# Altium footprint library Miscellaneous THD.PcbLib: 216 footprints (part 14 of 15) (continued)
## WURTH_651 005 136 421 [mm] "Mini USB 2.0 Type B Vertical 5 Contacts WR-COM"
height 9.2
pads (7):
  round 1.3 hole 0.6: 1(-1.6,-0.95) 2(-0.8,0.95) 3(0,-0.95) 4(0.8,0.95) 5(1.6,-0.95)
  round 2.7 hole 2: 6(-4.2,0) 6(4.2,0)
Top Overlay:
  lines w0.2: -3.85,-1.664 -3.85,-1.98 3.85,-1.98 3.85,-1.664 ; -3.794,1.651 cw(c-3.35,1.42) -3.35,1.92 -1.043,1.92 ; -3.35,1.52 -1.622,1.52 ; -3.33,-1.461 -3.33,-1.48 ccw(c-2.83,-1.48) -2.83,-1.98 ; -2.93,-1.13 -2.93,-1.48 ccw(c-2.83,-1.48) -2.83,-1.58 -2.377,-1.58 ; -2.625,1.52 -2.625,1.27 -2.025,1.27 -2.025,1.52 ; -2.3,-0.236 -2.3,0.377 -2.3,0.47 cw(c-2.2,0.47) -2.2,0.57 -1.725,0.57 ; -1.8,0.57 -1.8,1.02 ; -0.557,1.92 0.557,1.92 ; 1.043,1.92 3.351,1.92 ; 1.622,1.52 3.35,1.52 ; 1.725,0.57 2.2,0.57 cw(c2.2,0.47) 2.3,0.47 2.3,0.377 2.3,-0.236 ; 1.8,0.57 1.8,1.02 ; 2.025,1.52 2.025,1.27 2.625,1.27 2.625,1.52 ; 2.377,-1.58 2.83,-1.58 ccw(c2.83,-1.48) 2.93,-1.48 2.93,-1.13 ; 2.83,-1.98 ccw(c2.83,-1.48) 3.33,-1.48 3.33,-1.461 ; 3.35,1.92 cw(c3.351,1.423) 3.793,1.651
Mechanical 8:
  lines w0.05: -4.7,0 -4.2,0 ; -4.2,-0.5 -4.2,0 ; -4.2,0.5 -4.2,0 ; -3.7,0 -4.2,0 ; -2.1,-0.95 -1.6,-0.95 ; -1.6,-1.45 -1.6,-0.95 ; -1.6,-0.45 -1.6,-0.95 ; -1.3,0.95 -0.8,0.95 ; -1.1,-0.95 -1.6,-0.95 ; -0.8,0.45 -0.8,0.95 ; -0.8,1.45 -0.8,0.95 ; -0.5,-0.95 0,-0.95 ; -0.5,0 0,0 ; -0.3,0.95 -0.8,0.95 ; 0,-1.45 0,-0.95 ; 0,-0.45 0,-0.95 ; 0,0.5 0,0 ; 0.3,0.95 0.8,0.95 ; 0.5,-0.95 0,-0.95 ; 0.5,0 0,0 ; 0.8,0.45 0.8,0.95 ; 0.8,1.45 0.8,0.95 ; 1.1,-0.95 1.6,-0.95 ; 1.3,0.95 0.8,0.95 ; 1.6,-1.45 1.6,-0.95 ; 1.6,-0.45 1.6,-0.95 ; 2.1,-0.95 1.6,-0.95 ; 3.7,0 4.2,0 ; 4.2,-0.5 4.2,0 ; 4.2,0.5 4.2,0 ; 4.7,0 4.2,0
Mechanical 14:
  lines w0.1: -3.85,-0.75 -5.1,-0.75 -5.1,0.75 -3.85,0.75 ; -3.45,-0.38 -3.33,-0.38 ; -3.45,-0.237 -3.45,-1.88 ; -3.45,0.52 -3.1,0.52 -3.1,-0.004 ; -2.83,-1.98 cw(c-2.83,-1.48) -3.33,-1.48 -3.33,-0.38 ; -2.625,1.52 -2.625,1.421 -2.625,1.298 -2.625,1.27 -2.025,1.27 -2.025,1.298 -2.025,1.421 -2.025,1.52 ; -1.8,0.57 -1.8,1.02 -1.4,1.02 -1.4,0.57 ; -1.785,0.57 -1.785,0.82 -1.415,0.82 -1.415,0.57 ; -1.7,-0.355 -1.7,-0.105 ; -1.5,-0.355 -1.5,-0.105 ; -1,0.57 -1,1.02 -0.76,1.02 ; -0.985,0.57 -0.985,0.82 -0.615,0.82 -0.615,0.57 ; -0.9,-0.355 -0.9,-0.105 ; -0.76,1.52 -0.76,1.298 -0.76,1.02 ; -0.7,-0.355 -0.7,-0.105 ; -0.6,0.57 -0.6,1.02 ; -0.2,0.57 -0.2,1.02 ; -0.185,0.57 -0.185,0.82 0.185,0.82 0.185,0.57 ; -0.1,-0.355 -0.1,-0.105 ; 0.1,-0.355 0.1,-0.105 ; 0.2,0.57 0.2,1.02 ; 0.6,0.57 0.6,1.02 ; 0.615,0.57 0.615,0.82 0.985,0.82 0.985,0.57 ; 0.7,-0.355 0.7,-0.105 ; 0.74,1.52 0.74,1.298 0.74,1.02 ; 0.9,-0.355 0.9,-0.105 ; 1,0.57 1,1.02 0.74,1.02 ; 1.4,0.57 1.4,1.02 1.8,1.02 1.8,0.57 ; 1.415,0.57 1.415,0.82 1.785,0.82 1.785,0.57 ; 1.5,-0.355 1.5,-0.105 ; 1.7,-0.355 1.7,-0.105 ; 2.025,1.52 2.025,1.421 2.025,1.298 2.025,1.27 2.625,1.27 2.625,1.298 2.625,1.421 2.625,1.52 ; 2.83,-1.98 ccw(c2.83,-1.48) 3.33,-1.48 3.33,-0.38 ; 3.1,-0.004 3.1,0.52 3.45,0.52 ; 3.45,-0.38 3.33,-0.38 ; 3.45,-0.237 3.45,-1.88 ; 3.85,-0.75 5.1,-0.75 5.1,0.75 3.85,0.75 ; -3.85,0.32 ccw(c-3.35,0.32) -3.659,-0.073 -3.368,-0.301 cw(c-3.43,-0.38) -3.33,-0.38 ; -3.85,0.32 -3.85,0.22 -3.85,-1.98 -3.45,-1.98 -3.45,-1.88 ; -3.85,0.32 -3.85,1.42 cw(c-3.35,1.42) -3.35,1.92 3.35,1.92 cw(c3.35,1.42) 3.85,1.42 3.85,0.32 ; -3.45,-1.88 ccw(c-3.35,-1.88) -3.35,-1.98 3.35,-1.98 ccw(c3.35,-1.88) 3.45,-1.88 ; -3.35,1.52 ccw(c-3.35,1.42) -3.45,1.42 -3.45,0.32 ccw(c-3.35,0.32) -3.412,0.241 -3.121,0.013 cw(c-3.43,-0.38) -2.93,-0.38 -2.93,-1.48 ccw(c-2.83,-1.48) -2.83,-1.58 2.83,-1.58 ccw(c2.83,-1.48) 2.93,-1.48 2.93,-0.38 cw(c3.43,-0.38) 3.121,0.013 3.412,0.241 ccw(c3.35,0.32) 3.45,0.32 3.45,1.42 ccw(c3.35,1.42) 3.35,1.52 ; -3.35,1.52 3.35,1.52 ; -3.35,1.52 3.35,1.52 ; -0.76,1.02 0.74,1.02 ; 3.33,-0.38 cw(c3.43,-0.38) 3.368,-0.301 3.659,-0.073 ccw(c3.35,0.32) 3.85,0.32 ; 3.45,-1.88 3.45,-1.98 3.85,-1.98 3.85,0.22 3.85,0.32 ; -2.3,-0.389 ccw(c-2.2,-0.389) -2.271,-0.459 -1.729,-1.001 ccw(c-1.659,-0.93) -1.659,-1.03 1.659,-1.03 ccw(c1.659,-0.93) 1.729,-1.001 2.271,-0.459 ccw(c2.2,-0.389) 2.3,-0.389 2.3,0.377 2.3,0.47 ccw(c2.2,0.47) 2.2,0.57 -2.2,0.57 ccw(c-2.2,0.47) -2.3,0.47 -2.3,0.377 -2.3,-0.389 ; -1.8,-0.355 -1.4,-0.355 -1.4,-0.105 -1.8,-0.105 -1.8,-0.355 ; -1,-0.355 -0.6,-0.355 -0.6,-0.105 -1,-0.105 -1,-0.355 ; -0.2,-0.355 -0.2,-0.105 0.2,-0.105 0.2,-0.355 -0.2,-0.355 ; 0.6,-0.355 1,-0.355 1,-0.105 0.6,-0.105 0.6,-0.355 ; 1.4,-0.355 1.8,-0.355 1.8,-0.105 1.4,-0.105 1.4,-0.355
3D body "WURTH_651 005 136 421.stp": height 9.2, standoff -2.8, extent -5.098,-1.98 5.099,1.92

## WURTH_662 002 211 22 [mm] "2 Contacts, Pitch 3mm, Dual Row Vertical Header"
height 10.05
pads (4):
  round 1.7 hole 1: 1(0,-1.5) 2(0,1.5)
  round 0.5 hole 1 unplated mask+0.25: P1(-3,2.44) P2(3,2.44)
Top Overlay:
  circle w0.3: c1.805,-4.377 r0.15
  lines w0.2: -3.35,-3.43 3.35,-3.43 ; -3.35,1.665 -3.35,-3.93 -2.45,-3.93 -2.45,-3.43 ; -3.35,3.215 -3.35,3.43 3.35,3.43 3.35,3.215 ; -2.35,-3.43 -2.35,-1.03 -1.95,-1.03 -1.95,-3.43 ; -2.35,-1.5 -1.95,-1.5 ; -2.35,1.5 -1.95,1.5 ; -2.35,1.892 -2.35,0.95 -1.95,0.95 -1.95,2.75 -2.209,2.75 ; -1.1,-3.43 -1.1,-3.93 -0.15,-3.93 -0.15,-3.43 ; -0.7,3.43 -0.7,4.83 0.7,4.83 0.7,3.43 ; 0.15,-3.43 0.15,-3.93 1.1,-3.93 1.1,-3.43 ; 1.95,-3.43 1.95,-1.03 2.35,-1.03 2.35,-3.43 ; 1.95,-1.5 2.35,-1.5 ; 1.95,1.5 2.35,1.5 ; 2.209,2.75 1.95,2.75 1.95,0.95 2.35,0.95 2.35,1.892 ; 2.45,-3.43 2.45,-3.93 3.35,-3.93 3.35,1.665 ; -2.35,-0.64 -2.35,0.56 -1.95,0.56 -1.95,-0.64 -2.35,-0.64 ; -1.25,-2.75 0.75,-2.75 1.25,-2.25 1.25,-0.25 -1.25,-0.25 -1.25,-2.75 ; -1.25,0.25 -1.25,2.75 1.25,2.75 1.25,0.25 -1.25,0.25 ; 1.95,-0.64 2.35,-0.64 2.35,0.56 1.95,0.56 1.95,-0.64
Mechanical 8:
  lines w0.05: -3.5,2.44 -3,2.44 ; -3,1.94 -3,2.44 ; -3,2.94 -3,2.44 ; -2.5,2.44 -3,2.44 ; -0.5,-1.5 0,-1.5 ; -0.5,1.5 0,1.5 ; 0,-2 0,-1.5 ; 0,-1 0,-1.5 ; 0,1 0,1.5 ; 0,2 0,1.5 ; 0.5,-1.5 0,-1.5 ; 0.5,1.5 0,1.5 ; 2.5,2.44 3,2.44 ; 3,1.94 3,2.44 ; 3,2.94 3,2.44 ; 3.5,2.44 3,2.44
Mechanical 14:
  circle w0.3: c1.805,-4.377 r0.15
  lines w0.1: -3.35,-3.43 3.35,-3.43 ; -2.45,-3.43 -2.45,-3.93 -3.35,-3.93 -3.35,3.43 3.35,3.43 3.35,-3.93 2.45,-3.93 2.45,-3.43 ; -2.35,-3.43 -2.35,-1.03 -1.95,-1.03 -1.95,-3.43 ; -2.35,-1.5 -1.95,-1.5 ; -2.35,1.5 -1.95,1.5 ; -1.1,-3.43 -1.1,-3.93 -0.15,-3.93 -0.15,-3.43 ; -0.7,3.43 -0.7,4.83 0.7,4.83 0.7,3.43 ; 0.15,-3.43 0.15,-3.93 1.1,-3.93 1.1,-3.43 ; 1.95,-3.43 1.95,-1.03 2.35,-1.03 2.35,-3.43 ; 1.95,-1.5 2.35,-1.5 ; 1.95,1.5 2.35,1.5 ; -0.32,-1.82 -0.12,-1.62 ; -0.32,-1.82 -0.32,-1.18 ; -0.32,-1.82 0.32,-1.82 ; -0.32,-1.18 -0.12,-1.38 ; -0.32,-1.18 0.32,-1.18 ; -0.32,1.18 -0.32,1.82 ; -0.32,1.18 -0.12,1.38 ; -0.32,1.18 0.32,1.18 ; -0.32,1.82 0.32,1.82 ; -0.32,1.82 -0.12,1.62 ; -0.12,-1.62 -0.12,-1.38 ; -0.12,-1.62 0.12,-1.62 ; -0.12,-1.38 0.12,-1.38 ; -0.12,1.38 0.12,1.38 ; -0.12,1.38 -0.12,1.62 ; -0.12,1.62 0.12,1.62 ; 0.12,-1.62 0.32,-1.82 ; 0.12,-1.62 0.12,-1.38 ; 0.12,-1.38 0.32,-1.18 ; 0.12,1.38 0.32,1.18 ; 0.12,1.38 0.12,1.62 ; 0.12,1.62 0.32,1.82 ; 0.32,-1.82 0.32,-1.18 ; 0.32,1.18 0.32,1.82 ; -2.35,-0.64 -2.35,0.56 -1.95,0.56 -1.95,-0.64 -2.35,-0.64 ; -2.35,0.95 -2.35,2.75 -1.95,2.75 -1.95,0.95 -2.35,0.95 ; -1.25,-2.75 0.75,-2.75 1.25,-2.25 1.25,-0.25 -1.25,-0.25 -1.25,-2.75 ; -1.25,0.25 -1.25,2.75 1.25,2.75 1.25,0.25 -1.25,0.25 ; 1.95,-0.64 2.35,-0.64 2.35,0.56 1.95,0.56 1.95,-0.64 ; 1.95,0.95 2.35,0.95 2.35,2.75 1.95,2.75 1.95,0.95
3D body "WURTH_662 002 211 22.stp": height 9.9, standoff -3.2, extent -3.35,-3.93 3.35,4.83

## WURTH_662 004 110 22 [mm] "4 Contacts, Pitch 3mm, Single Row Angled Header"
height 5.57
pads (6):
  round 1.7 hole 1: 1(-4.5,0) 2(-1.5,0) 3(1.5,0) 4(4.5,0)
  round 0.5 hole 3 unplated mask+1.25: P1(-2.35,4.32) P2(2.35,4.32)
Top Overlay:
  circle w0.3: c-5.55,-1.8 r0.15
  lines w0.2: -5.132,-1.02 -6.525,-1.02 -6.525,0.48 -6.925,0.48 -6.925,-1.02 -7.825,-1.02 -7.825,7.466 -6.411,8.88 6.411,8.88 7.825,7.466 7.825,-1.02 6.925,-1.02 6.925,0.48 6.525,0.48 6.525,-1.02 5.132,-1.02 ; -3.868,-1.02 -2.132,-1.02 ; -1.3,5.843 -1.3,8.08 1.3,8.08 1.3,5.843 ; -1.3,6.88 1.3,6.88 ; -0.995,5.58 0.995,5.58 ; -0.868,-1.02 0.868,-1.02 ; 2.132,-1.02 3.868,-1.02
Mechanical 8:
  lines w0.05: -5,0 -4.5,0 ; -4.5,-0.5 -4.5,0 ; -4.5,0.5 -4.5,0 ; -4,0 -4.5,0 ; -2.85,4.32 -2.35,4.32 ; -2.35,3.82 -2.35,4.32 ; -2.35,4.82 -2.35,4.32 ; -2,0 -1.5,0 ; -1.85,4.32 -2.35,4.32 ; -1.5,-0.5 -1.5,0 ; -1.5,0.5 -1.5,0 ; -1,0 -1.5,0 ; -0.5,0 0,0 ; 0,-0.5 0,0 ; 0,0.5 0,0 ; 0.5,0 0,0 ; 1,0 1.5,0 ; 1.5,-0.5 1.5,0 ; 1.5,0.5 1.5,0 ; 1.85,4.32 2.35,4.32 ; 2,0 1.5,0 ; 2.35,3.82 2.35,4.32 ; 2.35,4.82 2.35,4.32 ; 2.85,4.32 2.35,4.32 ; 4,0 4.5,0 ; 4.5,-0.5 4.5,0 ; 4.5,0.5 4.5,0 ; 5,0 4.5,0
Mechanical 14:
  circle w0.3: c-5.55,-1.8 r0.15
  lines w0.1: -1.3,5.33 -1.3,8.08 1.3,8.08 1.3,5.33 ; -1.3,5.58 1.3,5.58 ; -1.3,6.88 1.3,6.88 ; -4.82,-0.32 -4.18,-0.32 ; -4.82,-0.32 -5.05,-1.02 -6.525,-1.02 -6.525,0.48 -6.925,0.48 -6.925,-1.02 -7.825,-1.02 -7.825,7.466 -6.411,8.88 6.411,8.88 7.825,7.466 7.825,-1.02 6.925,-1.02 6.925,0.48 6.525,0.48 6.525,-1.02 5.05,-1.02 4.82,-0.32 ; -4.82,-0.32 -4.82,0.32 -4.18,0.32 -4.18,-0.32 ; -4.18,-0.32 -3.95,-1.02 -2.05,-1.02 -1.82,-0.32 ; -1.82,-0.32 -1.18,-0.32 ; -1.82,-0.32 -1.82,0.32 -1.18,0.32 -1.18,-0.32 ; -1.18,-0.32 -0.95,-1.02 0.95,-1.02 1.18,-0.32 ; 1.18,-0.32 1.82,-0.32 ; 1.18,-0.32 1.18,0.32 1.82,0.32 1.82,-0.32 ; 1.82,-0.32 2.05,-1.02 3.95,-1.02 4.18,-0.32 ; 4.18,-0.32 4.82,-0.32 ; 4.18,-0.32 4.18,0.32 4.82,0.32 4.82,-0.32
3D body "WURTH_662 004 110 22.stp": height 5.57, standoff -3.18, extent -7.825,-1.02 7.825,8.88

## WURTH_691 313 410 004 [mm] "4 Contacts, Single Row, Right Angled Serie 3134-7.62mm"
height 8.5
pads (4):
  round 2.3 hole 1.6: 1(-11.43,0) 2(-3.81,0) 3(3.81,0) 4(11.43,0)
Top Overlay:
  circle w0.3: c-11.45,2.7 r0.15
  lines w0.2: -15.24,-8.7 15.24,-8.7 ; -15.24,-7 15.24,-7 ; -12.355,-10 -12.03,-8.7 ; -10.83,-8.7 -10.505,-10 ; -4.735,-10 -4.41,-8.7 ; -3.21,-8.7 -2.885,-10 ; 2.885,-10 3.21,-8.7 ; 4.41,-8.7 4.735,-10 ; 10.505,-10 10.83,-8.7 ; 12.03,-8.7 12.355,-10 ; -15.24,-10 -15.24,2 15.24,2 15.24,-10 -15.24,-10
Mechanical 8:
  lines w0.05: -11.93,0 -11.43,0 ; -11.43,-0.5 -11.43,0 ; -11.43,0.5 -11.43,0 ; -10.93,0 -11.43,0 ; -4.31,0 -3.81,0 ; -3.81,-0.5 -3.81,0 ; -3.81,0.5 -3.81,0 ; -3.31,0 -3.81,0 ; -0.5,0 0,0 ; 0,-0.5 0,0 ; 0,0.5 0,0 ; 0.5,0 0,0 ; 3.31,0 3.81,0 ; 3.81,-0.5 3.81,0 ; 3.81,0.5 3.81,0 ; 4.31,0 3.81,0 ; 10.93,0 11.43,0 ; 11.43,-0.5 11.43,0 ; 11.43,0.5 11.43,0 ; 11.93,0 11.43,0
Mechanical 14:
  circle w0.3: c-11.45,2.7 r0.15
  lines w0.1: -15.24,-8.7 15.24,-8.7 ; -15.24,-7 15.24,-7 ; -12.355,-10 -12.03,-8.7 ; -10.83,-8.7 -10.505,-10 ; -4.735,-10 -4.41,-8.7 ; -3.21,-8.7 -2.885,-10 ; 2.885,-10 3.21,-8.7 ; 4.41,-8.7 4.735,-10 ; 10.505,-10 10.83,-8.7 ; 12.03,-8.7 12.355,-10 ; -15.24,-10 -15.24,2 15.24,2 15.24,-10 -15.24,-10
3D body "WURTH_691 313 410 004.stp": height 8.5, standoff -4, extent -15.24,-10 15.24,2

## WURTH_691 382 000 006 [mm] "6 Contacts, Pitch 2.5mm, Vertical PCB Header"
height 10.3
pads (6):
  round 2.1 hole 1.4: 1(-6.35,0) 2(-3.81,0) 3(-1.27,0) 4(1.27,0) 5(3.81,0) 6(6.35,0)
Top Overlay:
  circle w0.3: c-6.35,-4.6 r0.15
  lines w0.2: -8.5,4 8.5,4 ; -7.5,-0.75 -7.5,-2 7.5,-2 ; -7.5,0.75 -7.5,2.15 -6.75,2.15 ; -6.75,-2 -6.75,-1.308 ; -6.75,1.308 -6.75,2.8 -7.25,2.8 -7.25,3.4 -5.25,3.4 -5.25,2.8 -5.75,2.8 -5.75,1.308 ; -6.5,-2 -6.5,-3.2 -5,-3.2 -5,-2 ; -5.75,-2 -5.75,-1.308 ; -5.75,2.15 -4.25,2.15 ; -4.25,-2 -4.25,-1.308 ; -4.25,1.308 -4.25,2.8 -4.75,2.8 -4.75,3.4 -2.75,3.4 -2.75,2.8 -3.25,2.8 -3.25,1.308 ; -3.25,-2 -3.25,-1.308 ; -3.25,2.15 -1.75,2.15 ; -1.75,-2 -1.75,-1.308 ; -1.75,1.308 -1.75,2.8 -2.25,2.8 -2.25,3.4 -0.25,3.4 -0.25,2.8 -0.75,2.8 -0.75,1.308 ; -0.75,-2 -0.75,-1.308 ; -0.75,2.15 0.75,2.15 ; 0.75,-2 0.75,-1.308 ; 0.75,1.308 0.75,2.8 0.25,2.8 0.25,3.4 2.25,3.4 2.25,2.8 1.75,2.8 1.75,1.308 ; 1.75,-2 1.75,-1.308 ; 1.75,2.15 3.25,2.15 ; 3.25,-2 3.25,-1.308 ; 3.25,1.308 3.25,2.8 2.75,2.8 2.75,3.4 4.75,3.4 4.75,2.8 4.25,2.8 4.25,1.308 ; 4.25,-2 4.25,-1.308 ; 4.25,2.15 5.75,2.15 ; 5.75,-2 5.75,-1.308 ; 5.75,1.308 5.75,2.8 5.25,2.8 5.25,3.4 7.25,3.4 7.25,2.8 6.75,2.8 6.75,1.308 ; 6,-2 6,-3.2 7.5,-3.2 7.5,-0.75 ; 6.75,-2 6.75,-1.308 ; 6.75,2.15 7.5,2.15 7.5,0.75 ; -8.5,-3.9 -8.5,4.2 8.5,4.2 8.5,-3.9 -8.5,-3.9
Mechanical 8:
  lines w0.1: -6.75,0 -6.25,0 ; -6.25,-0.5 -6.25,0 ; -6.25,0.5 -6.25,0 ; -5.75,0 -6.25,0 ; -4.25,0 -3.75,0 ; -3.75,-0.5 -3.75,0 ; -3.75,0.5 -3.75,0 ; -3.25,0 -3.75,0 ; -1.75,0 -1.25,0 ; -1.25,-0.5 -1.25,0 ; -1.25,0.5 -1.25,0 ; -0.75,0 -1.25,0 ; -0.5,0 0,0 ; 0,-0.5 0,0 ; 0,0.5 0,0 ; 0.5,0 0,0 ; 0.75,0 1.25,0 ; 1.25,-0.5 1.25,0 ; 1.25,0.5 1.25,0 ; 1.75,0 1.25,0 ; 3.25,0 3.75,0 ; 3.75,-0.5 3.75,0 ; 3.75,0.5 3.75,0 ; 4.25,0 3.75,0 ; 5.75,0 6.25,0 ; 6.25,-0.5 6.25,0 ; 6.25,0.5 6.25,0 ; 6.75,0 6.25,0
Mechanical 14:
  drawing of 159 lines, arcs and shapes, not listed
3D body "WURTH_691 382 000 006.stp": height 10.1, standoff -3.5, extent -8.5,-3.9 8.5,4.2

## WURTH_61303421021 [mm] "34 Contacts, Pitch 2.54 mm THT Angled Dual Pin Header WR-PHD"
height 5.08
pads (34):
  round 1.8 hole 1.1: 1(-20.322,-1.27) 2(-20.322,1.27) 3(-17.782,-1.27) 4(-17.782,1.27) 5(-15.242,-1.27) 6(-15.242,1.27) 7(-12.702,-1.27) 8(-12.702,1.27) 9(-10.162,-1.27) 10(-10.162,1.27) 11(-7.622,-1.27) 12(-7.622,1.27) 13(-5.082,-1.27) 14(-5.082,1.27) 15(-2.542,-1.27) 16(-2.542,1.27) 17(-0.002,-1.27) 18(-0.002,1.27) 19(2.538,-1.27) 20(2.538,1.27) 21(5.078,-1.27) 22(5.078,1.27) 23(7.618,-1.27) 24(7.618,1.27) 25(10.158,-1.27) 26(10.158,1.27) 27(12.698,-1.27) 28(12.698,1.27) 29(15.238,-1.27) 30(15.238,1.27) 31(17.778,-1.27) 32(17.778,1.27) 33(20.318,-1.27) 34(20.318,1.27)
Top Overlay:
  drawing of 259 lines, arcs and shapes, not listed
Mechanical 8:
  drawing of 174 lines, arcs and shapes, not listed
Mechanical 14:
  drawing of 310 lines, arcs and shapes, not listed
3D body "WURTH_61303421021.stp": height 5.08, standoff -3, extent -21.592,-1.59 21.588,11.31

## WURTH_615006138521 [mm] "RJ12 Connector, 6P6C,  Straight With Ears"
height 16
pads (8):
  round 1.6 hole 0.9: 1(3.175,-1.27) 2(1.905,1.27) 3(0.635,-1.27) 4(-0.635,1.27) 5(-1.905,-1.27) 6(-3.175,1.27)
  round 1 hole 3.3 unplated mask+1.1: M1(-5.08,7.62) M2(5.08,7.62)
Top Overlay:
  lines w0.2: -6.75,-1.82 -3.055,-1.82 ; -6.75,0.705 -7.85,0.705 -7.85,11.455 -6.75,11.455 ; -6.75,5.62 -6.75,-2.52 -3.575,-2.52 -3.521,-1.82 ; -6.75,9.62 -6.75,13.98 6.75,13.98 6.75,9.61 ; -5.4,5.62 -5.4,4.68 -4.95,4.68 ; -4.95,5.62 -4.95,2.28 -4.325,2.28 ; -4.55,-2.52 -4.55,-1.82 ; -3.35,9.62 -3.35,10.96 3.35,10.96 3.35,9.61 ; -3.075,6.962 -2.8,6.962 ; -2.8,2.42 -2.8,7.78 -2.3,7.78 -2.3,2.42 ; -2.8,5.317 cw(c-2.554,5.25) -2.3,5.27 ; -2.783,-2.42 -2.775,-2.52 -2.305,-2.52 -2.277,-2.42 ; -2.3,6.962 -1.78,6.962 ; -2.1,10.96 -2.1,13.262 2.1,13.262 2.1,10.96 ; -2.1,12.38 2.1,12.38 ; -2.025,1.28 -1.785,1.28 ; -2.025,2.28 -1.785,2.28 ; -1.78,2.42 -1.78,7.78 -1.28,7.78 -1.28,2.42 ; -1.78,5.317 cw(c-1.534,5.25) -1.28,5.27 ; -1.533,-2.42 -1.505,-2.52 -1.035,-2.52 -1.027,-2.42 ; -1.28,6.962 -0.76,6.962 ; -0.76,2.42 -0.76,7.78 -0.26,7.78 -0.26,2.42 ; -0.76,5.317 cw(c-0.514,5.25) -0.26,5.27 ; -0.26,6.962 0.26,6.962 ; -0.243,-2.42 -0.235,-2.52 0.235,-2.52 0.263,-2.42 ; 0.26,2.42 0.26,7.78 0.76,7.78 0.76,2.42 ; 0.26,5.317 cw(c0.506,5.25) 0.76,5.27 ; 0.515,1.28 0.755,1.28 ; 0.515,2.28 0.755,2.28 ; 0.76,6.962 1.28,6.962 ; 1.007,-2.42 1.035,-2.52 1.505,-2.52 1.513,-2.42 ; 1.28,2.42 1.28,7.78 1.78,7.78 1.78,2.42 ; 1.28,5.317 cw(c1.526,5.25) 1.78,5.27 ; 1.78,6.962 2.3,6.962 ; 2.297,-2.42 2.305,-2.52 2.775,-2.52 2.803,-2.42 ; 2.3,2.42 2.3,7.78 2.8,7.78 2.8,2.42 ; 2.3,5.317 cw(c2.546,5.25) 2.8,5.27 ; 2.8,6.962 3.08,6.962 ; 3.055,1.28 3.25,1.28 3.25,2.28 ; 3.055,2.28 4.95,2.28 4.95,5.61 ; 3.547,-2.42 3.575,-2.52 6.75,-2.52 6.75,5.61 ; 4.325,-1.82 6.75,-1.82 ; 4.55,-2.52 4.55,-1.82 ; 4.95,4.68 5.4,4.68 5.4,5.61 ; 6.75,0.705 7.85,0.705 7.85,11.455 6.75,11.455
  text "1" at 3.145,-4.2 h1.2
Mechanical 8:
  circle w0.05: c-5.08,7.62 r1.65
  circle w0.05: c5.08,7.61 r1.65
  circle w0.05: c1.905,1.27 r0.45
  circle w0.05: c1.905,1.27 r0.8
  circle w0.05: c3.175,-1.27 r0.45
  circle w0.05: c3.175,-1.27 r0.8
  circle w0.05: c0.635,-1.27 r0.45
  circle w0.05: c0.635,-1.27 r0.8
  circle w0.05: c-0.635,1.27 r0.45
  circle w0.05: c-0.635,1.27 r0.8
  circle w0.05: c-3.175,1.27 r0.45
  circle w0.05: c-3.175,1.27 r0.8
  circle w0.05: c-1.905,-1.27 r0.45
  circle w0.05: c-1.905,-1.27 r0.8
  lines w0.05: -5.58,7.62 -5.08,7.62 ; -5.08,7.12 -5.08,7.62 ; -5.08,8.12 -5.08,7.62 ; -4.58,7.62 -5.08,7.62 ; -3.675,1.27 -3.175,1.27 ; -3.175,0.77 -3.175,1.27 ; -3.175,1.77 -3.175,1.27 ; -2.675,1.27 -3.175,1.27 ; -2.405,-1.27 -1.905,-1.27 ; -1.905,-1.77 -1.905,-1.27 ; -1.905,-0.77 -1.905,-1.27 ; -1.405,-1.27 -1.905,-1.27 ; -1.135,1.27 -0.635,1.27 ; -0.635,0.77 -0.635,1.27 ; -0.635,1.77 -0.635,1.27 ; -0.5,0 0,0 ; -0.135,1.27 -0.635,1.27 ; 0,-0.5 0,0 ; 0,0.5 0,0 ; 0.135,-1.27 0.635,-1.27 ; 0.5,0 0,0 ; 0.635,-1.77 0.635,-1.27 ; 0.635,-0.77 0.635,-1.27 ; 1.135,-1.27 0.635,-1.27 ; 1.405,1.27 1.905,1.27 ; 1.905,0.77 1.905,1.27 ; 1.905,1.77 1.905,1.27 ; 2.405,1.27 1.905,1.27 ; 2.675,-1.27 3.175,-1.27 ; 3.175,-1.77 3.175,-1.27 ; 3.175,-0.77 3.175,-1.27 ; 3.675,-1.27 3.175,-1.27 ; 4.58,7.62 5.08,7.62 ; 5.08,7.12 5.08,7.62 ; 5.08,8.12 5.08,7.62 ; 5.58,7.62 5.08,7.62
Mechanical 14:
  lines w0.1: -6.75,-1.82 6.75,-1.82 ; -6.75,0.705 -7.85,0.705 -7.85,11.455 -6.75,11.455 ; -4.95,4.68 -5.4,4.68 -5.4,8.18 -3.35,8.18 ; -4.55,-2.52 -4.55,-1.82 ; -3.521,-1.82 -3.575,-2.52 -6.75,-2.52 -6.75,13.98 6.75,13.98 6.75,-2.52 3.575,-2.52 3.381,-1.82 ; -3.35,9.18 -4.95,9.18 -4.95,2.28 -2.8,2.28 ; -3.25,2.28 -3.25,1.28 3.25,1.28 3.25,2.28 ; -2.829,-1.82 -2.775,-2.52 -2.305,-2.52 -2.111,-1.82 ; -2.8,1.28 -2.8,7.78 -2.3,7.78 -2.3,1.28 ; -2.8,5.317 cw(c-2.554,5.25) -2.3,5.27 ; -2.8,6.962 -3.35,6.962 -3.35,10.96 3.35,10.96 3.35,6.962 2.8,6.962 ; -2.3,2.28 -1.78,2.28 ; -2.3,6.962 -1.78,6.962 ; -2.1,10.96 -2.1,13.262 2.1,13.262 2.1,10.96 ; -2.1,12.38 2.1,12.38 ; -1.78,1.28 -1.78,7.78 -1.28,7.78 -1.28,1.28 ; -1.78,5.317 cw(c-1.534,5.25) -1.28,5.27 ; -1.699,-1.82 -1.505,-2.52 -1.035,-2.52 -0.981,-1.82 ; -1.295,2.28 -0.76,2.28 ; -1.28,6.962 -0.76,6.962 ; -0.76,1.28 -0.76,7.78 -0.26,7.78 -0.26,1.28 ; -0.76,5.317 cw(c-0.514,5.25) -0.26,5.27 ; -0.289,-1.82 -0.235,-2.52 0.235,-2.52 0.429,-1.82 ; -0.26,2.28 0.26,2.28 ; -0.26,6.962 0.26,6.962 ; 0.26,1.28 0.26,7.78 0.76,7.78 0.76,1.28 ; 0.26,5.317 cw(c0.506,5.25) 0.76,5.27 ; 0.76,2.28 1.28,2.28 ; 0.76,6.962 1.28,6.962 ; 0.841,-1.82 1.035,-2.52 1.505,-2.52 1.559,-1.82 ; 1.28,1.28 1.28,7.78 1.78,7.78 1.78,1.28 ; 1.28,5.317 cw(c1.526,5.25) 1.78,5.27 ; 1.78,2.28 2.3,2.28 ; 1.78,6.962 2.3,6.962 ; 2.251,-1.82 2.305,-2.52 2.775,-2.52 2.969,-1.82 ; 2.3,1.28 2.3,7.78 2.8,7.78 2.8,1.28 ; 2.3,5.317 cw(c2.546,5.25) 2.8,5.27 ; 2.8,2.28 4.95,2.28 4.95,9.18 3.35,9.18 ; 3.35,8.18 5.4,8.18 5.4,4.68 4.95,4.68 ; 4.55,-2.52 4.55,-1.82 ; 6.75,0.705 7.85,0.705 7.85,11.455 6.75,11.455
  text "1" at 3.145,-4.2 h1.2
3D body "WURTH_615006138521.stp": height 16.3, standoff -3.29, extent -7.85,-2.52 7.85,13.98

## WURTH_618009231221 [mm] "Right Angle 9 Male Contacts D-SUB Connector With 4-40 UNC Screwlocks and Boardlock"
height 12.5
pads (11):
  round 1.7 hole 1: 1(5.54,-1.42) 2(2.77,-1.42) 3(0,-1.42) 4(-2.77,-1.42) 5(-5.54,-1.42) 6(4.155,1.42) 7(1.385,1.42) 8(-1.385,1.42) 9(-4.155,1.42)
  round 4.4 hole 3.2: 10(-12.5,0) 11(12.5,0)
Top Overlay:
  lines w0.2: -15.4,5.2 -8.75,5.2 -8.75,-3 ; -15.4,7.05 15.4,7.05 ; -15.4,9.05 15.4,9.05 ; -15.35,5.2 -15.35,2.35 ccw(c-14.05,2.35) -14.77,1.268 ; -15.347,5 -9.65,5 ; -14.875,9.5 -14.875,14.3 -10.125,14.3 -10.125,9.5 ; -14.3,-3 -14.3,-1.876 ; -13.75,5 -13.75,3.2 ; -12.5,9.5 -12.5,14.3 ; -11.25,5 -11.25,3.2 ; -10.7,-3 -10.7,-1.876 ; -10.23,1.268 ccw(c-10.95,2.35) -9.65,2.35 -9.65,5.2 ; -8.9,9.5 -8.9,15 cw(c-8.4,15) -8.4,15.5 8.4,15.5 cw(c8.4,15) 8.9,15 8.9,9.5 ; 8.75,-3 8.75,5.2 15.4,5.2 ; 9.65,5 15.35,5 ; 9.65,5.2 9.65,2.35 ccw(c10.95,2.35) 10.23,1.268 ; 10.125,9.5 10.125,14.3 14.875,14.3 14.875,9.5 ; 10.7,-3 10.7,-1.876 ; 11.25,5 11.25,3.2 ; 12.5,9.5 12.5,14.3 ; 13.75,5 13.75,3.2 ; 14.3,-3 14.3,-1.876 ; 14.77,1.268 ccw(c14.05,2.35) 15.35,2.35 15.35,5.2 ; -13.75,3.2 -11.25,3.2 ; -13.75,3.2 -13.25,2.7 -11.75,2.7 -11.25,3.2 ; 11.25,3.2 13.75,3.2 ; 11.25,3.2 11.75,2.7 13.25,2.7 13.75,3.2 ; -15.4,-3 -15.4,9.5 15.4,9.5 15.4,-3 -15.4,-3
  text "9" at -6.857,0.95 h1.2
  text "5" at -7.857,-2.007 h1.2
  text "1" at 7.141,-1.982 h1.2
  text "6" at 6,1 h1.2
Mechanical 8:
  lines w0.1: -13,0 -12.5,0 ; -12.5,-0.5 -12.5,0 ; -12.5,0.5 -12.5,0 ; -12,0 -12.5,0 ; -6.04,-1.42 -5.54,-1.42 ; -5.54,-1.92 -5.54,-1.42 ; -5.54,-0.92 -5.54,-1.42 ; -5.04,-1.42 -5.54,-1.42 ; -4.655,1.42 -4.155,1.42 ; -4.155,0.92 -4.155,1.42 ; -4.155,1.92 -4.155,1.42 ; -3.655,1.42 -4.155,1.42 ; -3.27,-1.42 -2.77,-1.42 ; -2.77,-1.92 -2.77,-1.42 ; -2.77,-0.92 -2.77,-1.42 ; -2.27,-1.42 -2.77,-1.42 ; -1.885,1.42 -1.385,1.42 ; -1.385,0.92 -1.385,1.42 ; -1.385,1.92 -1.385,1.42 ; -0.885,1.42 -1.385,1.42 ; -0.5,-1.42 0,-1.42 ; -0.5,0 0,0 ; 0,-1.92 0,-1.42 ; 0,-0.92 0,-1.42 ; 0,-0.5 0,0 ; 0,0.5 0,0 ; 0.5,-1.42 0,-1.42 ; 0.5,0 0,0 ; 0.885,1.42 1.385,1.42 ; 1.385,0.92 1.385,1.42 ; 1.385,1.92 1.385,1.42 ; 1.885,1.42 1.385,1.42 ; 2.27,-1.42 2.77,-1.42 ; 2.77,-1.92 2.77,-1.42 ; 2.77,-0.92 2.77,-1.42 ; 3.27,-1.42 2.77,-1.42 ; 3.655,1.42 4.155,1.42 ; 4.155,0.92 4.155,1.42 ; 4.155,1.92 4.155,1.42 ; 4.655,1.42 4.155,1.42 ; 5.04,-1.42 5.54,-1.42 ; 5.54,-1.92 5.54,-1.42 ; 5.54,-0.92 5.54,-1.42 ; 6.04,-1.42 5.54,-1.42 ; 12,0 12.5,0 ; 12.5,-0.5 12.5,0 ; 12.5,0.5 12.5,0 ; 13,0 12.5,0
Mechanical 14:
  lines w0.1: -15.4,5.2 -8.75,5.2 -8.75,-3 ; -15.4,7.05 15.4,7.05 ; -15.4,9.05 15.4,9.05 ; -15.35,5.2 -15.35,2.35 ccw(c-14.05,2.35) -14.05,1.05 -14.05,0.2 ; -15.347,5 -9.65,5 ; -14.875,9.5 -14.875,14.3 -10.125,14.3 -10.125,9.5 ; -14.3,-3 -14.3,1.074 ; -14.3,-0.2 -13.25,-0.2 -13.25,0.3 cw(c-12.5,0.3) -11.75,0.3 -11.75,-0.2 -10.7,-0.2 ; -14.3,0 ccw(c-12.5,0) -10.7,0 ; -14.3,0.2 -13.25,0.2 ; -13.75,5 -13.75,3.2 ; -12.5,9.5 -12.5,14.3 ; -11.75,0.2 -10.7,0.2 ; -11.25,5 -11.25,3.2 ; -10.95,0.2 -10.95,1.05 ccw(c-10.95,2.35) -9.65,2.35 -9.65,5.2 ; -10.7,-3 -10.7,1.074 ; -8.9,9.5 -8.9,15 cw(c-8.4,15) -8.4,15.5 8.4,15.5 cw(c8.4,15) 8.9,15 8.9,9.5 ; 8.75,-3 8.75,5.2 15.4,5.2 ; 9.65,5 15.35,5 ; 9.65,5.2 9.65,2.35 ccw(c10.95,2.35) 10.95,1.05 10.95,0.2 ; 10.125,9.5 10.125,14.3 14.875,14.3 14.875,9.5 ; 10.7,-3 10.7,1.074 ; 10.7,-0.2 11.75,-0.2 11.75,0.3 cw(c12.5,0.3) 13.25,0.3 13.25,-0.2 14.3,-0.2 ; 10.7,0 ccw(c12.5,0) 14.3,0 ; 10.7,0.2 11.75,0.2 ; 11.25,5 11.25,3.2 ; 12.5,9.5 12.5,14.3 ; 13.25,0.2 14.3,0.2 ; 13.75,5 13.75,3.2 ; 14.05,0.2 14.05,1.05 ccw(c14.05,2.35) 15.35,2.35 15.35,5.2 ; 14.3,-3 14.3,1.074 ; -13.75,3.2 -11.25,3.2 ; -13.75,3.2 -13.25,2.7 -11.75,2.7 -11.25,3.2 ; 11.25,3.2 13.75,3.2 ; 11.25,3.2 11.75,2.7 13.25,2.7 13.75,3.2 ; -15.4,-3 -15.4,9.5 15.4,9.5 15.4,-3 -15.4,-3
3D body "WURTH_618009231221.stp": height 12.5, standoff -4, extent -15.4,-3 15.4,15.5